# Altium footprint library my_PcbLib.PcbLib: 58 footprints (part 3 of 4)
Each footprint in its own frame and in the unit in brackets; x right, y up, seen from the top. Pads: shape width x height; smd on the part's side, far side on the other; paste and mask are expansions set on the pad; w line width, h text height; cw(c..) or ccw(c..) is an arc to the next point about the centre after c.
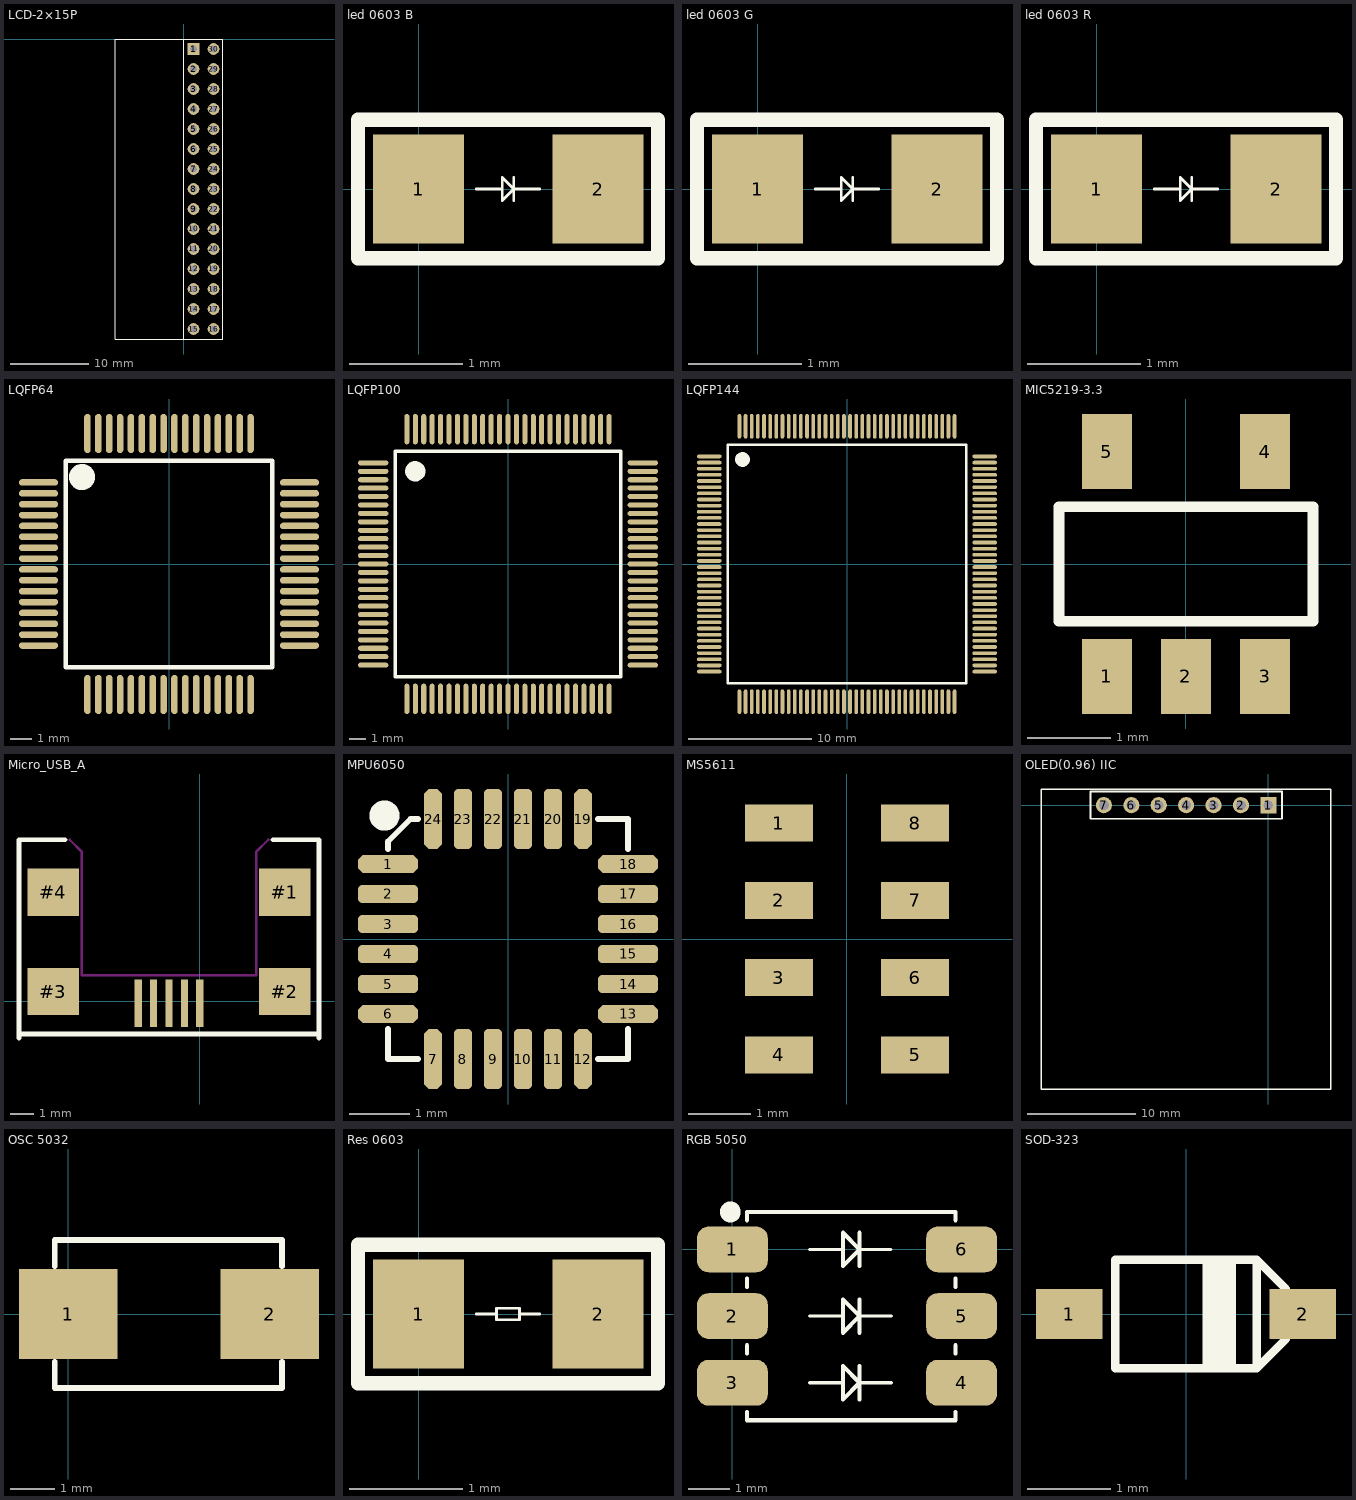
[diagram p2: the footprints below, top view; thin cyan lines are the x and y axes]

## LCD-2×15P [mm]
pads (30):
  rect 1.5x1.5 hole 0.9: 1(1.27,-1.27)
  round 1.5 hole 0.9: 2(1.27,-3.81) 3(1.27,-6.35) 4(1.27,-8.89) 5(1.27,-11.43) 6(1.27,-13.97) 7(1.27,-16.51) 8(1.27,-19.05) 9(1.27,-21.59) 10(1.27,-24.13) 11(1.27,-26.67) 12(1.27,-29.21) 13(1.27,-31.75) 14(1.27,-34.29) 15(1.27,-36.83) 16(3.81,-36.83) 17(3.81,-34.29) 18(3.81,-31.75) 19(3.81,-29.21) 20(3.81,-26.67) 21(3.81,-24.13) 22(3.81,-21.59) 23(3.81,-19.05) 24(3.81,-16.51) 25(3.81,-13.97) 26(3.81,-11.43) 27(3.81,-8.89) 28(3.81,-6.35) 29(3.81,-3.81) 30(3.81,-1.27)
Top Overlay:
  lines w0.025: 0,-38.1 -8.687,-38.1 -8.687,0 0,0
  lines w0.152: 2.5,-38.1 5,-38.1 5,0 2.5,0 ; 2.54,-38.1 0,-38.1 0,0 2.54,0
3D body "User Library-ZL262-5SG.STEP": height 8.4, standoff -3.15, extent 2.5,-38.1 5,-25.4
3D body "User Library-ZL262-5SG.STEP": height 8.4, standoff -3.15, extent 0,-38.1 2.5,-25.4
3D body "User Library-ZL262-10SG.STEP": height 8.4, standoff -3.15, extent 2.5,-25.4 5,0
3D body "User Library-ZL262-10SG.STEP": height 8.4, standoff -3.15, extent 0,-25.4 2.5,0

## led 0603 B [mm]
pads (2):
  rect 0.8x0.96 smd: 1(0,0) 2(1.58,0)
Top Overlay:
  lines w0.025: 0.508,0 0.737,0 ; 0.838,-0.102 0.838,0.102 ; 1.067,0 0.838,0 ; 0.838,0 0.737,-0.102 0.737,0.102 0.838,0
  lines w0.127: -0.533,-0.61 -0.533,0.61 2.108,0.61 2.108,-0.61 -0.533,-0.61
3D body "User Library-LED_0603_B.STEP": height 0.6, standoff 0, extent -0.013,-0.4 1.588,0.4

## led 0603 G [mm]
pads (2):
  rect 0.8x0.96 smd: 1(0,0) 2(1.58,0)
Top Overlay:
  lines w0.025: 0.508,0 0.737,0 ; 0.838,-0.102 0.838,0.102 ; 1.067,0 0.838,0 ; 0.838,0 0.737,-0.102 0.737,0.102 0.838,0
  lines w0.127: -0.533,-0.61 2.108,-0.61 2.108,0.61 -0.533,0.61 -0.533,-0.61
3D body "User Library-LED_0603_G.STEP": height 0.6, standoff 0, extent -0.013,-0.4 1.588,0.4

## led 0603 R [mm]
pads (2):
  rect 0.8x0.96 smd: 1(0,0) 2(1.58,0)
Top Overlay:
  lines w0.025: 0.508,0 0.737,0 ; 0.838,-0.102 0.838,0.102 ; 1.067,0 0.838,0 ; 0.838,0 0.737,0.102 0.737,-0.102 0.838,0
  lines w0.127: -0.533,-0.61 2.108,-0.61 2.108,0.61 -0.533,0.61 -0.533,-0.61
3D body "User Library-LED_0603_R.STEP": height 0.6, standoff 0, extent -0.013,-0.4 1.588,0.4

## LQFP64 [mm] "Thin QFP, 64-Leads, Body 10x10mm, Pitch 0.5mm, IPC Low Density"
pads (64):
  oval 1.8x0.3 smd: 1(-6,3.75) 2(-6,3.25) 3(-6,2.75) 4(-6,2.25) 5(-6,1.75) 6(-6,1.25) 7(-6,0.75) 8(-6,0.25) 9(-6,-0.25) 10(-6,-0.75) 11(-6,-1.25) 12(-6,-1.75) 13(-6,-2.25) 14(-6,-2.75) 15(-6,-3.25) 16(-6,-3.75) 33(6,-3.75) 34(6,-3.25) 35(6,-2.75) 36(6,-2.25) 37(6,-1.75) 38(6,-1.25) 39(6,-0.75) 40(6,-0.25) 41(6,0.25) 42(6,0.75) 43(6,1.25) 44(6,1.75) 45(6,2.25) 46(6,2.75) 47(6,3.25) 48(6,3.75)
  oval 0.3x1.8 smd: 17(-3.75,-6) 18(-3.25,-6) 19(-2.75,-6) 20(-2.25,-6) 21(-1.75,-6) 22(-1.25,-6) 23(-0.75,-6) 24(-0.25,-6) 25(0.25,-6) 26(0.75,-6) 27(1.25,-6) 28(1.75,-6) 29(2.25,-6) 30(2.75,-6) 31(3.25,-6) 32(3.75,-6) 49(3.75,6) 50(3.25,6) 51(2.75,6) 52(2.25,6) 53(1.75,6) 54(1.25,6) 55(0.75,6) 56(0.25,6) 57(-0.25,6) 58(-0.75,6) 59(-1.25,6) 60(-1.75,6) 61(-2.25,6) 62(-2.75,6) 63(-3.25,6) 64(-3.75,6)
Top Overlay:
  circle w0.6: c-4,4 r0.3
  lines w0.2: -4.75,-4.75 -4.75,4.75 4.75,4.75 4.75,-4.75 -4.75,-4.75
3D body "User Library-LQFP64-2.STEP": height 1.62, standoff -0.01, extent -6.072,-6.072 6.072,6.072

## LQFP100 [mm] "Thin QFP, 100-Leads, Body 14x14mm, Pitch 0.5mm, IPC Low Density"
height 1.6
pads (100):
  oval 1.8x0.3 smd: 1(-8,6) 2(-8,5.5) 3(-8,5) 4(-8,4.5) 5(-8,4) 6(-8,3.5) 7(-8,3) 8(-8,2.5) 9(-8,2) 10(-8,1.5) 11(-8,1) 12(-8,0.5) 13(-8,0) 14(-8,-0.5) 15(-8,-1) 16(-8,-1.5) 17(-8,-2) 18(-8,-2.5) 19(-8,-3) 20(-8,-3.5) 21(-8,-4) 22(-8,-4.5) 23(-8,-5) 24(-8,-5.5) 25(-8,-6) 51(8,-6) 52(8,-5.5) 53(8,-5) 54(8,-4.5) 55(8,-4) 56(8,-3.5) 57(8,-3) 58(8,-2.5) 59(8,-2) 60(8,-1.5) 61(8,-1) 62(8,-0.5) 63(8,0) 64(8,0.5) 65(8,1) 66(8,1.5) 67(8,2) 68(8,2.5) 69(8,3) 70(8,3.5) 71(8,4) 72(8,4.5) 73(8,5) 74(8,5.5) 75(8,6)
  oval 0.3x1.8 smd: 26(-6,-8) 27(-5.5,-8) 28(-5,-8) 29(-4.5,-8) 30(-4,-8) 31(-3.5,-8) 32(-3,-8) 33(-2.5,-8) 34(-2,-8) 35(-1.5,-8) 36(-1,-8) 37(-0.5,-8) 38(0,-8) 39(0.5,-8) 40(1,-8) 41(1.5,-8) 42(2,-8) 43(2.5,-8) 44(3,-8) 45(3.5,-8) 46(4,-8) 47(4.5,-8) 48(5,-8) 49(5.5,-8) 50(6,-8) 76(6,8) 77(5.5,8) 78(5,8) 79(4.5,8) 80(4,8) 81(3.5,8) 82(3,8) 83(2.5,8) 84(2,8) 85(1.5,8) 86(1,8) 87(0.5,8) 88(0,8) 89(-0.5,8) 90(-1,8) 91(-1.5,8) 92(-2,8) 93(-2.5,8) 94(-3,8) 95(-3.5,8) 96(-4,8) 97(-4.5,8) 98(-5,8) 99(-5.5,8) 100(-6,8)
Top Overlay:
  circle w0.6: c-5.5,5.5 r0.3
  lines w0.2: -6.7,-6.7 6.7,-6.7 6.7,6.7 -6.7,6.7 -6.7,-6.7
3D body "User Library-LQFP100-3.STEP": height 1.62, standoff -0.01, extent -8.072,-8.072 8.072,8.072

## LQFP144 [mm] "Thin QFP, 144-Leads, Body 20x20mm, Pitch 0.5mm, IPC Low Density"
height 1.6
pads (144):
  oval 2x0.3 smd: 1(-11.2,8.75) 2(-11.2,8.25) 3(-11.2,7.75) 4(-11.2,7.25) 5(-11.2,6.75) 6(-11.2,6.25) 7(-11.2,5.75) 8(-11.2,5.25) 9(-11.2,4.75) 10(-11.2,4.25) 11(-11.2,3.75) 12(-11.2,3.25) 13(-11.2,2.75) 14(-11.2,2.25) 15(-11.2,1.75) 16(-11.2,1.25) 17(-11.2,0.75) 18(-11.2,0.25) 19(-11.2,-0.25) 20(-11.2,-0.75) 21(-11.2,-1.25) 22(-11.2,-1.75) 23(-11.2,-2.25) 24(-11.2,-2.75) 25(-11.2,-3.25) 26(-11.2,-3.75) 27(-11.2,-4.25) 28(-11.2,-4.75) 29(-11.2,-5.25) 30(-11.2,-5.75) 31(-11.2,-6.25) 32(-11.2,-6.75) 33(-11.2,-7.25) 34(-11.2,-7.75) 35(-11.2,-8.25) 36(-11.2,-8.75) 73(11.2,-8.75) 74(11.2,-8.25) 75(11.2,-7.75) 76(11.2,-7.25) 77(11.2,-6.75) 78(11.2,-6.25) 79(11.2,-5.75) 80(11.2,-5.25) 81(11.2,-4.75) 82(11.2,-4.25) 83(11.2,-3.75) 84(11.2,-3.25) 85(11.2,-2.75) 86(11.2,-2.25) 87(11.2,-1.75) 88(11.2,-1.25) 89(11.2,-0.75) 90(11.2,-0.25) 91(11.2,0.25) 92(11.2,0.75) 93(11.2,1.25) 94(11.2,1.75) 95(11.2,2.25) 96(11.2,2.75) 97(11.2,3.25) 98(11.2,3.75) 99(11.2,4.25) 100(11.2,4.75) 101(11.2,5.25) 102(11.2,5.75) 103(11.2,6.25) 104(11.2,6.75) 105(11.2,7.25) 106(11.2,7.75) 107(11.2,8.25) 108(11.2,8.75)
  oval 0.3x2 smd: 37(-8.75,-11.2) 38(-8.25,-11.2) 39(-7.75,-11.2) 40(-7.25,-11.2) 41(-6.75,-11.2) 42(-6.25,-11.2) 43(-5.75,-11.2) 44(-5.25,-11.2) 45(-4.75,-11.2) 46(-4.25,-11.2) 47(-3.75,-11.2) 48(-3.25,-11.2) 49(-2.75,-11.2) 50(-2.25,-11.2) 51(-1.75,-11.2) 52(-1.25,-11.2) 53(-0.75,-11.2) 54(-0.25,-11.2) 55(0.25,-11.2) 56(0.75,-11.2) 57(1.25,-11.2) 58(1.75,-11.2) 59(2.25,-11.2) 60(2.75,-11.2) 61(3.25,-11.2) 62(3.75,-11.2) 63(4.25,-11.2) 64(4.75,-11.2) 65(5.25,-11.2) 66(5.75,-11.2) 67(6.25,-11.2) 68(6.75,-11.2) 69(7.25,-11.2) 70(7.75,-11.2) 71(8.25,-11.2) 72(8.75,-11.2) 109(8.75,11.2) 110(8.25,11.2) 111(7.75,11.2) 112(7.25,11.2) 113(6.75,11.2) 114(6.25,11.2) 115(5.75,11.2) 116(5.25,11.2) 117(4.75,11.2) 118(4.25,11.2) 119(3.75,11.2) 120(3.25,11.2) 121(2.75,11.2) 122(2.25,11.2) 123(1.75,11.2) 124(1.25,11.2) 125(0.75,11.2) 126(0.25,11.2) 127(-0.25,11.2) 128(-0.75,11.2) 129(-1.25,11.2) 130(-1.75,11.2) 131(-2.25,11.2) 132(-2.75,11.2) 133(-3.25,11.2) 134(-3.75,11.2) 135(-4.25,11.2) 136(-4.75,11.2) 137(-5.25,11.2) 138(-5.75,11.2) 139(-6.25,11.2) 140(-6.75,11.2) 141(-7.25,11.2) 142(-7.75,11.2) 143(-8.25,11.2) 144(-8.75,11.2)
Top Overlay:
  circle w0.6: c-8.5,8.5 r0.3
  lines w0.2: -9.7,-9.7 -9.7,9.7 9.7,9.7 9.7,-9.7 -9.7,-9.7
3D body "User Library-LQFP144-3.STEP": height 1.8, standoff -0.09, extent -11.101,-11.101 11.101,11.101

## MIC5219-3.3 [mm] "SOT23, 5-Leads"
height 1.15
pads (5):
  rect 0.6x0.9 smd: 1(-0.95,-1.35) 2(0,-1.35) 3(0.95,-1.35) 4(0.95,1.35) 5(-0.95,1.35)
Top Overlay:
  lines w0.127: -1.524,-0.686 1.524,-0.686 1.524,0.686 -1.524,0.686 -1.524,-0.686
3D body "User Library-SOT-23-5-1.STEP": height 1.1, standoff 0, extent -1.5,-1.25 1.5,1.25

## Micro_USB_A [mm]
pads (9):
  rect 0.3x2 smd: 1(0,-0.1) 2(-0.65,-0.1) 3(-1.3,-0.1) 4(-1.95,-0.1) 5(-2.6,-0.1)
  rect 2.2x2 smd: #1(3.6,4.6) #2(3.6,0.4) #3(-6.2,0.4) #4(-6.2,4.6)
Top Overlay:
  lines w0.2: -7.65,-1.578 -7.65,6.822 -5.7,6.822 ; -7.65,-1.4 5.05,-1.4 ; 3.1,6.822 5.05,6.822 5.05,-1.578
Keep-Out Layer:
  lines w0.1: -5.5,6.828 -5,6.328 -5,1.092 2.4,1.092 2.4,6.328 2.9,6.828

## MPU6050 [mm] "QFN, 24-Leads, Body 4.0x4.0mm, Pitch 0.5mm"
pads (24):
  oct 1x0.3 smd: 1(-2,1.25) 6(-2,-1.25) 13(2,-1.25) 18(2,1.25)
  rrect50% 1x0.3 smd: 2(-2,0.75) 3(-2,0.25) 4(-2,-0.25) 5(-2,-0.75) 14(2,-0.75) 15(2,-0.25) 16(2,0.25) 17(2,0.75)
  oct 0.3x1 smd: 7(-1.25,-2) 12(1.25,-2) 19(1.25,2) 24(-1.25,2)
  rrect50% 0.3x1 smd: 8(-0.75,-2) 9(-0.25,-2) 10(0.25,-2) 11(0.75,-2) 20(0.75,2) 21(0.25,2) 22(-0.25,2) 23(-0.75,2)
Top Overlay:
  circle w0.254: c-2.057,2.057 r0.125
  lines w0.1: -2,-1.5 -2,-2 -1.5,-2 ; -2,1.5 -2,1.625 -1.625,2 -1.5,2 ; 1.5,-2 2,-2 2,-1.5 ; 1.5,2 2,2 2,1.5
3D body "User Library-mpu-6050_qfn-24.STEP": height 0.9, standoff 0, extent -2.02,-2.02 2.02,2.02

## MS5611 [mm]
pads (8):
  rect 1.1x0.6 smd: 1(-1.1,1.875) 2(-1.1,0.625) 3(-1.1,-0.625) 4(-1.1,-1.875) 5(1.1,-1.875) 6(1.1,-0.625) 7(1.1,0.625) 8(1.1,1.875)
3D body "User Library-ms5611_STEP.STEP": height 1.02, standoff -0.01, extent -1.499,-2.511 1.501,2.489

## OLED(0.96) IIC [mm]
pads (7):
  rect 1.5x1.5 hole 0.9: 1(0,0)
  round 1.5 hole 0.9: 2(-2.54,0) 3(-5.08,0) 4(-7.62,0) 5(-10.16,0) 6(-12.7,0) 7(-15.24,0)
Top Overlay:
  lines w0.127: -21.031,-26.3 -21.031,1.5 5.766,1.5 5.766,-26.3 -21.031,-26.3
  lines w0.152: -16.485,-1.27 1.27,-1.27 1.27,1.27 -16.485,1.27 -16.485,-1.27
3D body "User Library-128x64I2COLEDDisplayAdafruit.STEP": height 11.47, standoff 0.63, extent -20.945,-26.336 5.755,1.524
3D body "User Library-PBS-07.STEP": height 8.4, standoff -3.2, extent -16.485,-1.27 1.295,1.27

## OSC 5032 [mm]
pads (2):
  rect 2.2x2 smd: 1(0,0) 2(4.5,0)
Top Overlay:
  lines w0.127: -0.305,-1.067 -0.305,-1.651 4.775,-1.651 4.775,-1.067 ; -0.305,1.067 -0.305,1.651 4.775,1.651 4.775,1.067
3D body "User Library-ABM3-1.STEP": height 1.3, standoff 0, extent -0.265,-1.6 4.735,1.6

## Res 0603 [mm]
pads (2):
  rect 0.8x0.96 smd: 1(0,0) 2(1.58,0)
Top Overlay:
  lines w0.025: 0.508,0 0.686,0 ; 0.889,0 1.067,0 ; 0.686,-0.051 0.889,-0.051 0.889,0.051 0.686,0.051 0.686,-0.051
  lines w0.127: -0.533,-0.61 2.108,-0.61 2.108,0.61 -0.533,0.61 -0.533,-0.61
3D body "User Library-RESC1608X05N.STEP": height 0.45, standoff 0, extent 0.012,-0.425 1.562,0.425

## RGB 5050 [mm]
pads (6):
  rrect50% 1.7x1.1 smd: 1(0,0) 2(0,-1.6) 3(0,-3.2) 4(5.5,-3.2) 5(5.5,-1.6) 6(5.5,0)
Top Overlay:
  circle w0.3: c-0.05,0.9 r0.1
  lines w0.076: 1.846,0 2.65,0 ; 1.855,-3.2 2.659,-3.2 ; 1.855,-1.6 2.659,-1.6 ; 3.05,0 3.802,0 ; 3.059,-3.2 3.811,-3.2 ; 3.059,-1.6 3.811,-1.6
  lines w0.1: 0.35,-3.9 0.35,-4.1 5.35,-4.1 5.35,-3.9 ; 0.35,-2.5 0.35,-2.3 ; 0.35,-0.9 0.35,-0.7 ; 0.35,0.7 0.35,0.9 5.35,0.9 5.35,0.7 ; 3.05,-3.6 3.05,-2.8 ; 3.05,-2 3.05,-1.2 ; 3.05,-0.4 3.05,0.4 ; 5.35,-2.5 5.35,-2.3 ; 5.35,-0.9 5.35,-0.7 ; 2.65,-2.8 2.65,-3.6 3.05,-3.2 2.65,-2.8 ; 2.65,-2.8 2.65,-2.8 ; 2.65,-1.2 2.65,-2 3.05,-1.6 2.65,-1.2 ; 2.65,-1.2 2.65,-1.2 ; 2.65,0.4 3.05,0 2.65,-0.4 2.65,0.4 ; 2.65,0.4 2.65,0.4
3D body "User Library-APA102C.STEP": height 1.4, standoff -0.15, extent 0.1,-4.1 5.6,0.9

## SOD-323 [mm]
pads (2):
  rect 0.8x0.6 smd: 1(-1.4,0) 2(1.4,0)
Top Overlay:
  lines w0.1: 1.2,-0.3 0.85,-0.65 ; 1.2,0.3 0.85,0.65 ; 0.85,-0.65 0.85,0.65 ; 0.85,-0.65 -0.85,-0.65 -0.85,0.65 0.85,0.65 ; 0.85,-0.65 0.85,-0.65 ; 0.85,0.65 0.85,0.65
  lines w0.2: 0.3,-0.6 0.3,0.6 ; 0.5,-0.6 0.5,0.6
3D body "User Library-SOD-323F-1.STEP": height 0.7, standoff -0.01, extent -1.257,-0.61 1.243,0.64